# Altium footprint library con-samtec.PCBLIB: 805 footprints (part 18 of 55)
Each footprint in its own frame and in the unit in brackets; x right, y up, seen from the top. Pads: shape width x height; smd on the part's side, far side on the other; paste and mask are expansions set on the pad; w line width, h text height; cw(c..) or ccw(c..) is an arc to the next point about the centre after c.
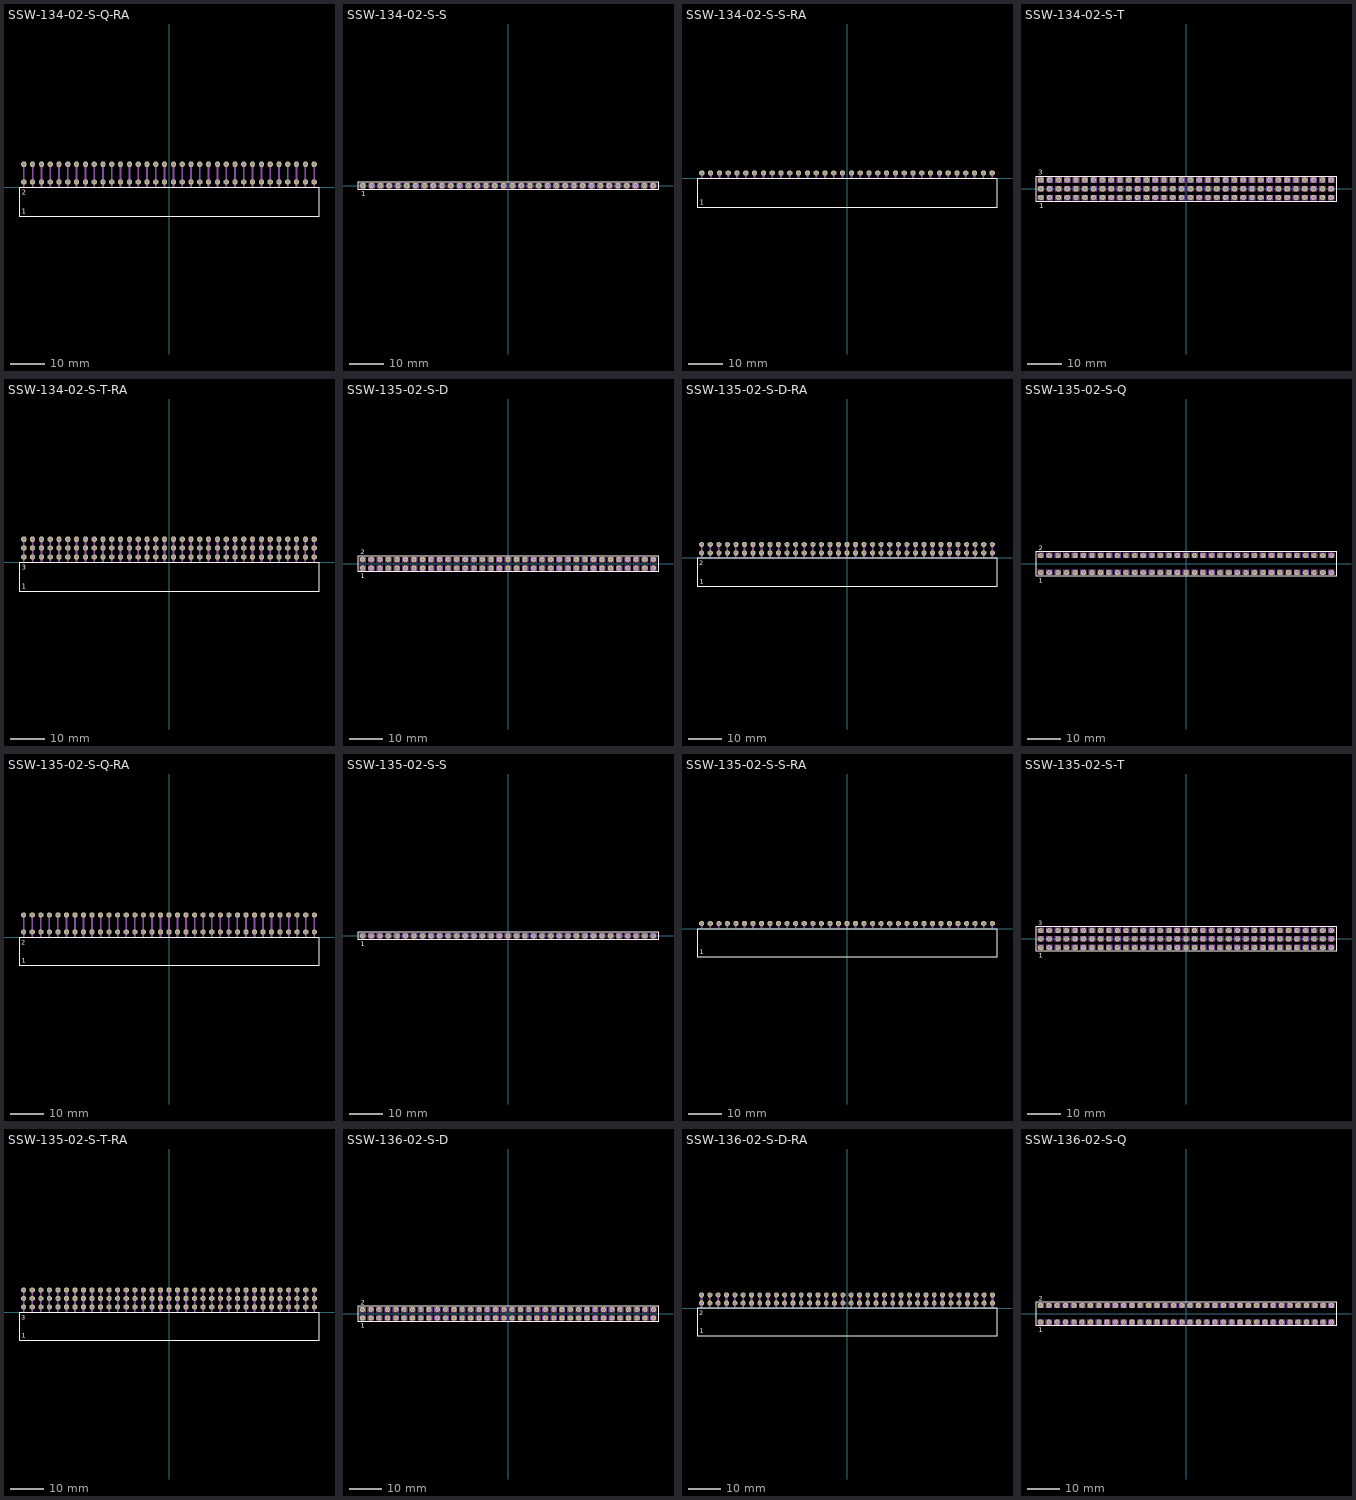
[diagram p17: the footprints below, top view; thin cyan lines are the x and y axes]

## SSW-134-02-S-Q-RA [mil]
pads (68):
  oct 59.06x59.06 hole 39.37: 1(-1650,60) 2(-1650,260) 3(-1550,60) 4(-1550,260) 5(-1450,60) 6(-1450,260) 7(-1350,60) 8(-1350,260) 9(-1250,60) 10(-1250,260) 11(-1150,60) 12(-1150,260) 13(-1050,60) 14(-1050,260) 15(-950,60) 16(-950,260) 17(-850,60) 18(-850,260) 19(-750,60) 20(-750,260) 21(-650,60) 22(-650,260) 23(-550,60) 24(-550,260) 25(-450,60) 26(-450,260) 27(-350,60) 28(-350,260) 29(-250,60) 30(-250,260) 31(-150,60) 32(-150,260) 33(-50,60) 34(-50,260) 35(50,60) 36(50,260) 37(150,60) 38(150,260) 39(250,60) 40(250,260) 41(350,60) 42(350,260) 43(450,60) 44(450,260) 45(550,60) 46(550,260) 47(650,60) 48(650,260) 49(750,60) 50(750,260) 51(850,60) 52(850,260) 53(950,60) 54(950,260) 55(1050,60) 56(1050,260) 57(1150,60) 58(1150,260) 59(1250,60) 60(1250,260) 61(1350,60) 62(1350,260) 63(1450,60) 64(1450,260) 65(1550,60) 66(1550,260) 67(1650,60) 68(1650,260)
Top Overlay:
  lines w8: -1705.08,-330.55 1705.08,-330.55 1705.08,-4.17 -1705.08,-4.17 -1705.08,-330.55
  text "1" at -1673.43,-301.18 h56.1
  text "2" at -1676.38,-86.61 h56.1
Mechanical 16:
  rectangle: -1660,0 -1640,270
  rectangle: -1560,0 -1540,270
  rectangle: -1460,0 -1440,270
  rectangle: -1360,0 -1340,270
  rectangle: -1260,0 -1240,270
  rectangle: -1160,0 -1140,270
  rectangle: -1060,0 -1040,270
  rectangle: -960,0 -940,270
  rectangle: -860,0 -840,270
  rectangle: -760,0 -740,270
  rectangle: -660,0 -640,270
  rectangle: -560,0 -540,270
  rectangle: -460,0 -440,270
  rectangle: -360,0 -340,270
  rectangle: -260,0 -240,270
  rectangle: -160,0 -140,270
  rectangle: -60,0 -40,270
  rectangle: 40,0 60,270
  rectangle: 140,0 160,270
  rectangle: 240,0 260,270
  rectangle: 340,0 360,270
  rectangle: 440,0 460,270
  rectangle: 540,0 560,270
  rectangle: 640,0 660,270
  rectangle: 740,0 760,270
  rectangle: 840,0 860,270
  rectangle: 940,0 960,270
  rectangle: 1040,0 1060,270
  rectangle: 1140,0 1160,270
  rectangle: 1240,0 1260,270
  rectangle: 1340,0 1360,270
  rectangle: 1440,0 1460,270
  rectangle: 1540,0 1560,270
  rectangle: 1640,0 1660,270

## SSW-134-02-S-S [mm]
pads (34):
  oct 1.5x1.5 hole 1: 1(-41.91,0) 2(-39.37,0) 3(-36.83,0) 4(-34.29,0) 5(-31.75,0) 6(-29.21,0) 7(-26.67,0) 8(-24.13,0) 9(-21.59,0) 10(-19.05,0) 11(-16.51,0) 12(-13.97,0) 13(-11.43,0) 14(-8.89,0) 15(-6.35,0) 16(-3.81,0) 17(-1.27,0) 18(1.27,0) 19(3.81,0) 20(6.35,0) 21(8.89,0) 22(11.43,0) 23(13.97,0) 24(16.51,0) 25(19.05,0) 26(21.59,0) 27(24.13,0) 28(26.67,0) 29(29.21,0) 30(31.75,0) 31(34.29,0) 32(36.83,0) 33(39.37,0) 34(41.91,0)
Top Overlay:
  lines w0.203: -43.309,-1.155 43.309,-1.155 43.309,1.155 -43.309,1.155 -43.309,-1.155
  text "1" at -42.418,-3.048 h1.42
Mechanical 16:
  lines w0.203: -42.655,-0.745 -41.155,-0.745 -41.155,0.755 -42.655,0.755 -42.655,-0.745 ; -40.115,-0.745 -38.615,-0.745 -38.615,0.755 -40.115,0.755 -40.115,-0.745 ; -37.575,-0.745 -36.075,-0.745 -36.075,0.755 -37.575,0.755 -37.575,-0.745 ; -35.035,-0.745 -33.535,-0.745 -33.535,0.755 -35.035,0.755 -35.035,-0.745 ; -32.495,-0.745 -30.995,-0.745 -30.995,0.755 -32.495,0.755 -32.495,-0.745 ; -29.955,-0.745 -28.455,-0.745 -28.455,0.755 -29.955,0.755 -29.955,-0.745 ; -27.415,-0.745 -25.915,-0.745 -25.915,0.755 -27.415,0.755 -27.415,-0.745 ; -24.875,-0.745 -23.375,-0.745 -23.375,0.755 -24.875,0.755 -24.875,-0.745 ; -22.335,-0.745 -20.835,-0.745 -20.835,0.755 -22.335,0.755 -22.335,-0.745 ; -19.795,-0.745 -18.295,-0.745 -18.295,0.755 -19.795,0.755 -19.795,-0.745 ; -17.255,-0.745 -15.755,-0.745 -15.755,0.755 -17.255,0.755 -17.255,-0.745 ; -14.715,-0.745 -13.215,-0.745 -13.215,0.755 -14.715,0.755 -14.715,-0.745 ; -12.175,-0.745 -10.675,-0.745 -10.675,0.755 -12.175,0.755 -12.175,-0.745 ; -9.635,-0.745 -8.135,-0.745 -8.135,0.755 -9.635,0.755 -9.635,-0.745 ; -7.095,-0.745 -5.595,-0.745 -5.595,0.755 -7.095,0.755 -7.095,-0.745 ; -4.555,-0.745 -3.055,-0.745 -3.055,0.755 -4.555,0.755 -4.555,-0.745 ; -2.015,-0.745 -0.515,-0.745 -0.515,0.755 -2.015,0.755 -2.015,-0.745 ; 0.525,-0.745 2.025,-0.745 2.025,0.755 0.525,0.755 0.525,-0.745 ; 3.065,-0.745 4.565,-0.745 4.565,0.755 3.065,0.755 3.065,-0.745 ; 5.605,-0.745 7.105,-0.745 7.105,0.755 5.605,0.755 5.605,-0.745 ; 8.145,-0.745 9.645,-0.745 9.645,0.755 8.145,0.755 8.145,-0.745 ; 10.685,-0.745 12.185,-0.745 12.185,0.755 10.685,0.755 10.685,-0.745 ; 13.225,-0.745 14.725,-0.745 14.725,0.755 13.225,0.755 13.225,-0.745 ; 15.765,-0.745 17.265,-0.745 17.265,0.755 15.765,0.755 15.765,-0.745 ; 18.305,-0.745 19.805,-0.745 19.805,0.755 18.305,0.755 18.305,-0.745 ; 20.845,-0.745 22.345,-0.745 22.345,0.755 20.845,0.755 20.845,-0.745 ; 23.385,-0.745 24.885,-0.745 24.885,0.755 23.385,0.755 23.385,-0.745 ; 25.925,-0.745 27.425,-0.745 27.425,0.755 25.925,0.755 25.925,-0.745 ; 28.465,-0.745 29.965,-0.745 29.965,0.755 28.465,0.755 28.465,-0.745 ; 31.005,-0.745 32.505,-0.745 32.505,0.755 31.005,0.755 31.005,-0.745 ; 33.545,-0.745 35.045,-0.745 35.045,0.755 33.545,0.755 33.545,-0.745 ; 36.085,-0.745 37.585,-0.745 37.585,0.755 36.085,0.755 36.085,-0.745 ; 38.625,-0.745 40.125,-0.745 40.125,0.755 38.625,0.755 38.625,-0.745 ; 41.165,-0.745 42.665,-0.745 42.665,0.755 41.165,0.755 41.165,-0.745

## SSW-134-02-S-S-RA [mil]
pads (34):
  oct 59.06x59.06 hole 39.37: 1(-1650,60) 2(-1550,60) 3(-1450,60) 4(-1350,60) 5(-1250,60) 6(-1150,60) 7(-1050,60) 8(-950,60) 9(-850,60) 10(-750,60) 11(-650,60) 12(-550,60) 13(-450,60) 14(-350,60) 15(-250,60) 16(-150,60) 17(-50,60) 18(50,60) 19(150,60) 20(250,60) 21(350,60) 22(450,60) 23(550,60) 24(650,60) 25(750,60) 26(850,60) 27(950,60) 28(1050,60) 29(1150,60) 30(1250,60) 31(1350,60) 32(1450,60) 33(1550,60) 34(1650,60)
Top Overlay:
  lines w8: -1705.08,-330.55 1705.08,-330.55 1705.08,-4.17 -1705.08,-4.17 -1705.08,-330.55
  text "1" at -1673.43,-301.18 h56.1
Mechanical 16:
  rectangle: -1660,0 -1640,70
  rectangle: -1560,0 -1540,70
  rectangle: -1460,0 -1440,70
  rectangle: -1360,0 -1340,70
  rectangle: -1260,0 -1240,70
  rectangle: -1160,0 -1140,70
  rectangle: -1060,0 -1040,70
  rectangle: -960,0 -940,70
  rectangle: -860,0 -840,70
  rectangle: -760,0 -740,70
  rectangle: -660,0 -640,70
  rectangle: -560,0 -540,70
  rectangle: -460,0 -440,70
  rectangle: -360,0 -340,70
  rectangle: -260,0 -240,70
  rectangle: -160,0 -140,70
  rectangle: -60,0 -40,70
  rectangle: 40,0 60,70
  rectangle: 140,0 160,70
  rectangle: 240,0 260,70
  rectangle: 340,0 360,70
  rectangle: 440,0 460,70
  rectangle: 540,0 560,70
  rectangle: 640,0 660,70
  rectangle: 740,0 760,70
  rectangle: 840,0 860,70
  rectangle: 940,0 960,70
  rectangle: 1040,0 1060,70
  rectangle: 1140,0 1160,70
  rectangle: 1240,0 1260,70
  rectangle: 1340,0 1360,70
  rectangle: 1440,0 1460,70
  rectangle: 1540,0 1560,70
  rectangle: 1640,0 1660,70

## SSW-134-02-S-T [mm]
pads (102):
  oct 1.5x1.5 hole 1: 1(-41.91,-2.54) 2(-41.91,0) 3(-41.91,2.54) 4(-39.37,-2.54) 5(-39.37,0) 6(-39.37,2.54) 7(-36.83,-2.54) 8(-36.83,0) 9(-36.83,2.54) 10(-34.29,-2.54) 11(-34.29,0) 12(-34.29,2.54) 13(-31.75,-2.54) 14(-31.75,0) 15(-31.75,2.54) 16(-29.21,-2.54) 17(-29.21,0) 18(-29.21,2.54) 19(-26.67,-2.54) 20(-26.67,0) 21(-26.67,2.54) 22(-24.13,-2.54) 23(-24.13,0) 24(-24.13,2.54) 25(-21.59,-2.54) 26(-21.59,0) 27(-21.59,2.54) 28(-19.05,-2.54) 29(-19.05,0) 30(-19.05,2.54) 31(-16.51,-2.54) 32(-16.51,0) 33(-16.51,2.54) 34(-13.97,-2.54) 35(-13.97,0) 36(-13.97,2.54) 37(-11.43,-2.54) 38(-11.43,0) 39(-11.43,2.54) 40(-8.89,-2.54) 41(-8.89,0) 42(-8.89,2.54) 43(-6.35,-2.54) 44(-6.35,0) 45(-6.35,2.54) 46(-3.81,-2.54) 47(-3.81,0) 48(-3.81,2.54) 49(-1.27,-2.54) 50(-1.27,0) 51(-1.27,2.54) 52(1.27,-2.54) 53(1.27,0) 54(1.27,2.54) 55(3.81,-2.54) 56(3.81,0) 57(3.81,2.54) 58(6.35,-2.54) 59(6.35,0) 60(6.35,2.54) 61(8.89,-2.54) 62(8.89,0) 63(8.89,2.54) 64(11.43,-2.54) 65(11.43,0) 66(11.43,2.54) 67(13.97,-2.54) 68(13.97,0) 69(13.97,2.54) 70(16.51,-2.54) 71(16.51,0) 72(16.51,2.54) 73(19.05,-2.54) 74(19.05,0) 75(19.05,2.54) 76(21.59,-2.54) 77(21.59,0) 78(21.59,2.54) 79(24.13,-2.54) 80(24.13,0) 81(24.13,2.54) 82(26.67,-2.54) 83(26.67,0) 84(26.67,2.54) 85(29.21,-2.54) 86(29.21,0) 87(29.21,2.54) 88(31.75,-2.54) 89(31.75,0) 90(31.75,2.54) 91(34.29,-2.54) 92(34.29,0) 93(34.29,2.54) 94(36.83,-2.54) 95(36.83,0) 96(36.83,2.54) 97(39.37,-2.54) 98(39.37,0) 99(39.37,2.54) 100(41.91,-2.54) 101(41.91,0) 102(41.91,2.54)
Top Overlay:
  lines w0.203: -43.309,-3.695 43.309,-3.695 43.309,3.695 -43.309,3.695 -43.309,-3.695
  text "1" at -42.418,-5.588 h1.42
  text "3" at -42.672,4.064 h1.42
Mechanical 16:
  drawing of 408 lines, arcs and shapes, not listed

## SSW-134-02-S-T-RA [mil]
pads (102):
  oct 59.06x59.06 hole 39.37: 1(-1650,60) 2(-1650,160) 3(-1650,260) 4(-1550,60) 5(-1550,160) 6(-1550,260) 7(-1450,60) 8(-1450,160) 9(-1450,260) 10(-1350,60) 11(-1350,160) 12(-1350,260) 13(-1250,60) 14(-1250,160) 15(-1250,260) 16(-1150,60) 17(-1150,160) 18(-1150,260) 19(-1050,60) 20(-1050,160) 21(-1050,260) 22(-950,60) 23(-950,160) 24(-950,260) 25(-850,60) 26(-850,160) 27(-850,260) 28(-750,60) 29(-750,160) 30(-750,260) 31(-650,60) 32(-650,160) 33(-650,260) 34(-550,60) 35(-550,160) 36(-550,260) 37(-450,60) 38(-450,160) 39(-450,260) 40(-350,60) 41(-350,160) 42(-350,260) 43(-250,60) 44(-250,160) 45(-250,260) 46(-150,60) 47(-150,160) 48(-150,260) 49(-50,60) 50(-50,160) 51(-50,260) 52(50,60) 53(50,160) 54(50,260) 55(150,60) 56(150,160) 57(150,260) 58(250,60) 59(250,160) 60(250,260) 61(350,60) 62(350,160) 63(350,260) 64(450,60) 65(450,160) 66(450,260) 67(550,60) 68(550,160) 69(550,260) 70(650,60) 71(650,160) 72(650,260) 73(750,60) 74(750,160) 75(750,260) 76(850,60) 77(850,160) 78(850,260) 79(950,60) 80(950,160) 81(950,260) 82(1050,60) 83(1050,160) 84(1050,260) 85(1150,60) 86(1150,160) 87(1150,260) 88(1250,60) 89(1250,160) 90(1250,260) 91(1350,60) 92(1350,160) 93(1350,260) 94(1450,60) 95(1450,160) 96(1450,260) 97(1550,60) 98(1550,160) 99(1550,260) 100(1650,60) 101(1650,160) 102(1650,260)
Top Overlay:
  lines w8: -1705.08,-330.55 1705.08,-330.55 1705.08,-4.17 -1705.08,-4.17 -1705.08,-330.55
  text "1" at -1673.43,-301.18 h56.1
  text "3" at -1676.38,-86.61 h56.1
Mechanical 16:
  rectangle: -1660,0 -1640,270
  rectangle: -1560,0 -1540,270
  rectangle: -1460,0 -1440,270
  rectangle: -1360,0 -1340,270
  rectangle: -1260,0 -1240,270
  rectangle: -1160,0 -1140,270
  rectangle: -1060,0 -1040,270
  rectangle: -960,0 -940,270
  rectangle: -860,0 -840,270
  rectangle: -760,0 -740,270
  rectangle: -660,0 -640,270
  rectangle: -560,0 -540,270
  rectangle: -460,0 -440,270
  rectangle: -360,0 -340,270
  rectangle: -260,0 -240,270
  rectangle: -160,0 -140,270
  rectangle: -60,0 -40,270
  rectangle: 40,0 60,270
  rectangle: 140,0 160,270
  rectangle: 240,0 260,270
  rectangle: 340,0 360,270
  rectangle: 440,0 460,270
  rectangle: 540,0 560,270
  rectangle: 640,0 660,270
  rectangle: 740,0 760,270
  rectangle: 840,0 860,270
  rectangle: 940,0 960,270
  rectangle: 1040,0 1060,270
  rectangle: 1140,0 1160,270
  rectangle: 1240,0 1260,270
  rectangle: 1340,0 1360,270
  rectangle: 1440,0 1460,270
  rectangle: 1540,0 1560,270
  rectangle: 1640,0 1660,270

## SSW-135-02-S-D [mm]
pads (70):
  oct 1.5x1.5 hole 1: 1(-43.18,-1.27) 2(-43.18,1.27) 3(-40.64,-1.27) 4(-40.64,1.27) 5(-38.1,-1.27) 6(-38.1,1.27) 7(-35.56,-1.27) 8(-35.56,1.27) 9(-33.02,-1.27) 10(-33.02,1.27) 11(-30.48,-1.27) 12(-30.48,1.27) 13(-27.94,-1.27) 14(-27.94,1.27) 15(-25.4,-1.27) 16(-25.4,1.27) 17(-22.86,-1.27) 18(-22.86,1.27) 19(-20.32,-1.27) 20(-20.32,1.27) 21(-17.78,-1.27) 22(-17.78,1.27) 23(-15.24,-1.27) 24(-15.24,1.27) 25(-12.7,-1.27) 26(-12.7,1.27) 27(-10.16,-1.27) 28(-10.16,1.27) 29(-7.62,-1.27) 30(-7.62,1.27) 31(-5.08,-1.27) 32(-5.08,1.27) 33(-2.54,-1.27) 34(-2.54,1.27) 35(0,-1.27) 36(0,1.27) 37(2.54,-1.27) 38(2.54,1.27) 39(5.08,-1.27) 40(5.08,1.27) 41(7.62,-1.27) 42(7.62,1.27) 43(10.16,-1.27) 44(10.16,1.27) 45(12.7,-1.27) 46(12.7,1.27) 47(15.24,-1.27) 48(15.24,1.27) 49(17.78,-1.27) 50(17.78,1.27) 51(20.32,-1.27) 52(20.32,1.27) 53(22.86,-1.27) 54(22.86,1.27) 55(25.4,-1.27) 56(25.4,1.27) 57(27.94,-1.27) 58(27.94,1.27) 59(30.48,-1.27) 60(30.48,1.27) 61(33.02,-1.27) 62(33.02,1.27) 63(35.56,-1.27) 64(35.56,1.27) 65(38.1,-1.27) 66(38.1,1.27) 67(40.64,-1.27) 68(40.64,1.27) 69(43.18,-1.27) 70(43.18,1.27)
Top Overlay:
  lines w0.203: -44.579,-2.425 44.579,-2.425 44.579,2.425 -44.579,2.425 -44.579,-2.425
  text "1" at -43.688,-4.318 h1.42
  text "2" at -43.688,2.794 h1.42
Mechanical 16:
  drawing of 280 lines, arcs and shapes, not listed

## SSW-135-02-S-D-RA [mil]
pads (70):
  oct 59.06x59.06 hole 39.37: 1(-1700,60) 2(-1700,160) 3(-1600,60) 4(-1600,160) 5(-1500,60) 6(-1500,160) 7(-1400,60) 8(-1400,160) 9(-1300,60) 10(-1300,160) 11(-1200,60) 12(-1200,160) 13(-1100,60) 14(-1100,160) 15(-1000,60) 16(-1000,160) 17(-900,60) 18(-900,160) 19(-800,60) 20(-800,160) 21(-700,60) 22(-700,160) 23(-600,60) 24(-600,160) 25(-500,60) 26(-500,160) 27(-400,60) 28(-400,160) 29(-300,60) 30(-300,160) 31(-200,60) 32(-200,160) 33(-100,60) 34(-100,160) 35(0,60) 36(0,160) 37(100,60) 38(100,160) 39(200,60) 40(200,160) 41(300,60) 42(300,160) 43(400,60) 44(400,160) 45(500,60) 46(500,160) 47(600,60) 48(600,160) 49(700,60) 50(700,160) 51(800,60) 52(800,160) 53(900,60) 54(900,160) 55(1000,60) 56(1000,160) 57(1100,60) 58(1100,160) 59(1200,60) 60(1200,160) 61(1300,60) 62(1300,160) 63(1400,60) 64(1400,160) 65(1500,60) 66(1500,160) 67(1600,60) 68(1600,160) 69(1700,60) 70(1700,160)
Top Overlay:
  lines w8: -1755.08,-330.55 1755.08,-330.55 1755.08,-4.17 -1755.08,-4.17 -1755.08,-330.55
  text "1" at -1723.43,-301.18 h56.1
  text "2" at -1726.38,-86.61 h56.1
Mechanical 16:
  rectangle: -1710,0 -1690,170
  rectangle: -1610,0 -1590,170
  rectangle: -1510,0 -1490,170
  rectangle: -1410,0 -1390,170
  rectangle: -1310,0 -1290,170
  rectangle: -1210,0 -1190,170
  rectangle: -1110,0 -1090,170
  rectangle: -1010,0 -990,170
  rectangle: -910,0 -890,170
  rectangle: -810,0 -790,170
  rectangle: -710,0 -690,170
  rectangle: -610,0 -590,170
  rectangle: -510,0 -490,170
  rectangle: -410,0 -390,170
  rectangle: -310,0 -290,170
  rectangle: -210,0 -190,170
  rectangle: -110,0 -90,170
  rectangle: -10,0 10,170
  rectangle: 90,0 110,170
  rectangle: 190,0 210,170
  rectangle: 290,0 310,170
  rectangle: 390,0 410,170
  rectangle: 490,0 510,170
  rectangle: 590,0 610,170
  rectangle: 690,0 710,170
  rectangle: 790,0 810,170
  rectangle: 890,0 910,170
  rectangle: 990,0 1010,170
  rectangle: 1090,0 1110,170
  rectangle: 1190,0 1210,170
  rectangle: 1290,0 1310,170
  rectangle: 1390,0 1410,170
  rectangle: 1490,0 1510,170
  rectangle: 1590,0 1610,170
  rectangle: 1690,0 1710,170

## SSW-135-02-S-Q [mm]
pads (70):
  oct 1.5x1.5 hole 1: 1(-43.18,-2.54) 2(-43.18,2.54) 3(-40.64,-2.54) 4(-40.64,2.54) 5(-38.1,-2.54) 6(-38.1,2.54) 7(-35.56,-2.54) 8(-35.56,2.54) 9(-33.02,-2.54) 10(-33.02,2.54) 11(-30.48,-2.54) 12(-30.48,2.54) 13(-27.94,-2.54) 14(-27.94,2.54) 15(-25.4,-2.54) 16(-25.4,2.54) 17(-22.86,-2.54) 18(-22.86,2.54) 19(-20.32,-2.54) 20(-20.32,2.54) 21(-17.78,-2.54) 22(-17.78,2.54) 23(-15.24,-2.54) 24(-15.24,2.54) 25(-12.7,-2.54) 26(-12.7,2.54) 27(-10.16,-2.54) 28(-10.16,2.54) 29(-7.62,-2.54) 30(-7.62,2.54) 31(-5.08,-2.54) 32(-5.08,2.54) 33(-2.54,-2.54) 34(-2.54,2.54) 35(0,-2.54) 36(0,2.54) 37(2.54,-2.54) 38(2.54,2.54) 39(5.08,-2.54) 40(5.08,2.54) 41(7.62,-2.54) 42(7.62,2.54) 43(10.16,-2.54) 44(10.16,2.54) 45(12.7,-2.54) 46(12.7,2.54) 47(15.24,-2.54) 48(15.24,2.54) 49(17.78,-2.54) 50(17.78,2.54) 51(20.32,-2.54) 52(20.32,2.54) 53(22.86,-2.54) 54(22.86,2.54) 55(25.4,-2.54) 56(25.4,2.54) 57(27.94,-2.54) 58(27.94,2.54) 59(30.48,-2.54) 60(30.48,2.54) 61(33.02,-2.54) 62(33.02,2.54) 63(35.56,-2.54) 64(35.56,2.54) 65(38.1,-2.54) 66(38.1,2.54) 67(40.64,-2.54) 68(40.64,2.54) 69(43.18,-2.54) 70(43.18,2.54)
Top Overlay:
  lines w0.203: -44.579,-3.695 44.579,-3.695 44.579,3.695 -44.579,3.695 -44.579,-3.695
  text "1" at -43.688,-5.588 h1.42
  text "2" at -43.688,4.064 h1.42
Mechanical 16:
  drawing of 280 lines, arcs and shapes, not listed

## SSW-135-02-S-Q-RA [mil]
pads (70):
  oct 59.06x59.06 hole 39.37: 1(-1700,60) 2(-1700,260) 3(-1600,60) 4(-1600,260) 5(-1500,60) 6(-1500,260) 7(-1400,60) 8(-1400,260) 9(-1300,60) 10(-1300,260) 11(-1200,60) 12(-1200,260) 13(-1100,60) 14(-1100,260) 15(-1000,60) 16(-1000,260) 17(-900,60) 18(-900,260) 19(-800,60) 20(-800,260) 21(-700,60) 22(-700,260) 23(-600,60) 24(-600,260) 25(-500,60) 26(-500,260) 27(-400,60) 28(-400,260) 29(-300,60) 30(-300,260) 31(-200,60) 32(-200,260) 33(-100,60) 34(-100,260) 35(0,60) 36(0,260) 37(100,60) 38(100,260) 39(200,60) 40(200,260) 41(300,60) 42(300,260) 43(400,60) 44(400,260) 45(500,60) 46(500,260) 47(600,60) 48(600,260) 49(700,60) 50(700,260) 51(800,60) 52(800,260) 53(900,60) 54(900,260) 55(1000,60) 56(1000,260) 57(1100,60) 58(1100,260) 59(1200,60) 60(1200,260) 61(1300,60) 62(1300,260) 63(1400,60) 64(1400,260) 65(1500,60) 66(1500,260) 67(1600,60) 68(1600,260) 69(1700,60) 70(1700,260)
Top Overlay:
  lines w8: -1755.08,-330.55 1755.08,-330.55 1755.08,-4.17 -1755.08,-4.17 -1755.08,-330.55
  text "1" at -1723.43,-301.18 h56.1
  text "2" at -1726.38,-86.61 h56.1
Mechanical 16:
  rectangle: -1710,0 -1690,270
  rectangle: -1610,0 -1590,270
  rectangle: -1510,0 -1490,270
  rectangle: -1410,0 -1390,270
  rectangle: -1310,0 -1290,270
  rectangle: -1210,0 -1190,270
  rectangle: -1110,0 -1090,270
  rectangle: -1010,0 -990,270
  rectangle: -910,0 -890,270
  rectangle: -810,0 -790,270
  rectangle: -710,0 -690,270
  rectangle: -610,0 -590,270
  rectangle: -510,0 -490,270
  rectangle: -410,0 -390,270
  rectangle: -310,0 -290,270
  rectangle: -210,0 -190,270
  rectangle: -110,0 -90,270
  rectangle: -10,0 10,270
  rectangle: 90,0 110,270
  rectangle: 190,0 210,270
  rectangle: 290,0 310,270
  rectangle: 390,0 410,270
  rectangle: 490,0 510,270
  rectangle: 590,0 610,270
  rectangle: 690,0 710,270
  rectangle: 790,0 810,270
  rectangle: 890,0 910,270
  rectangle: 990,0 1010,270
  rectangle: 1090,0 1110,270
  rectangle: 1190,0 1210,270
  rectangle: 1290,0 1310,270
  rectangle: 1390,0 1410,270
  rectangle: 1490,0 1510,270
  rectangle: 1590,0 1610,270
  rectangle: 1690,0 1710,270

## SSW-135-02-S-S [mm]
pads (35):
  oct 1.5x1.5 hole 1: 1(-43.18,0) 2(-40.64,0) 3(-38.1,0) 4(-35.56,0) 5(-33.02,0) 6(-30.48,0) 7(-27.94,0) 8(-25.4,0) 9(-22.86,0) 10(-20.32,0) 11(-17.78,0) 12(-15.24,0) 13(-12.7,0) 14(-10.16,0) 15(-7.62,0) 16(-5.08,0) 17(-2.54,0) 18(0,0) 19(2.54,0) 20(5.08,0) 21(7.62,0) 22(10.16,0) 23(12.7,0) 24(15.24,0) 25(17.78,0) 26(20.32,0) 27(22.86,0) 28(25.4,0) 29(27.94,0) 30(30.48,0) 31(33.02,0) 32(35.56,0) 33(38.1,0) 34(40.64,0) 35(43.18,0)
Top Overlay:
  lines w0.203: -44.579,-1.155 44.579,-1.155 44.579,1.155 -44.579,1.155 -44.579,-1.155
  text "1" at -43.688,-3.048 h1.42
Mechanical 16:
  lines w0.203: -43.925,-0.745 -42.425,-0.745 -42.425,0.755 -43.925,0.755 -43.925,-0.745 ; -41.385,-0.745 -39.885,-0.745 -39.885,0.755 -41.385,0.755 -41.385,-0.745 ; -38.845,-0.745 -37.345,-0.745 -37.345,0.755 -38.845,0.755 -38.845,-0.745 ; -36.305,-0.745 -34.805,-0.745 -34.805,0.755 -36.305,0.755 -36.305,-0.745 ; -33.765,-0.745 -32.265,-0.745 -32.265,0.755 -33.765,0.755 -33.765,-0.745 ; -31.225,-0.745 -29.725,-0.745 -29.725,0.755 -31.225,0.755 -31.225,-0.745 ; -28.685,-0.745 -27.185,-0.745 -27.185,0.755 -28.685,0.755 -28.685,-0.745 ; -26.145,-0.745 -24.645,-0.745 -24.645,0.755 -26.145,0.755 -26.145,-0.745 ; -23.605,-0.745 -22.105,-0.745 -22.105,0.755 -23.605,0.755 -23.605,-0.745 ; -21.065,-0.745 -19.565,-0.745 -19.565,0.755 -21.065,0.755 -21.065,-0.745 ; -18.525,-0.745 -17.025,-0.745 -17.025,0.755 -18.525,0.755 -18.525,-0.745 ; -15.985,-0.745 -14.485,-0.745 -14.485,0.755 -15.985,0.755 -15.985,-0.745 ; -13.445,-0.745 -11.945,-0.745 -11.945,0.755 -13.445,0.755 -13.445,-0.745 ; -10.905,-0.745 -9.405,-0.745 -9.405,0.755 -10.905,0.755 -10.905,-0.745 ; -8.365,-0.745 -6.865,-0.745 -6.865,0.755 -8.365,0.755 -8.365,-0.745 ; -5.825,-0.745 -4.325,-0.745 -4.325,0.755 -5.825,0.755 -5.825,-0.745 ; -3.285,-0.745 -1.785,-0.745 -1.785,0.755 -3.285,0.755 -3.285,-0.745 ; -0.745,-0.745 0.755,-0.745 0.755,0.755 -0.745,0.755 -0.745,-0.745 ; 1.795,-0.745 3.295,-0.745 3.295,0.755 1.795,0.755 1.795,-0.745 ; 4.335,-0.745 5.835,-0.745 5.835,0.755 4.335,0.755 4.335,-0.745 ; 6.875,-0.745 8.375,-0.745 8.375,0.755 6.875,0.755 6.875,-0.745 ; 9.415,-0.745 10.915,-0.745 10.915,0.755 9.415,0.755 9.415,-0.745 ; 11.955,-0.745 13.455,-0.745 13.455,0.755 11.955,0.755 11.955,-0.745 ; 14.495,-0.745 15.995,-0.745 15.995,0.755 14.495,0.755 14.495,-0.745 ; 17.035,-0.745 18.535,-0.745 18.535,0.755 17.035,0.755 17.035,-0.745 ; 19.575,-0.745 21.075,-0.745 21.075,0.755 19.575,0.755 19.575,-0.745 ; 22.115,-0.745 23.615,-0.745 23.615,0.755 22.115,0.755 22.115,-0.745 ; 24.655,-0.745 26.155,-0.745 26.155,0.755 24.655,0.755 24.655,-0.745 ; 27.195,-0.745 28.695,-0.745 28.695,0.755 27.195,0.755 27.195,-0.745 ; 29.735,-0.745 31.235,-0.745 31.235,0.755 29.735,0.755 29.735,-0.745 ; 32.275,-0.745 33.775,-0.745 33.775,0.755 32.275,0.755 32.275,-0.745 ; 34.815,-0.745 36.315,-0.745 36.315,0.755 34.815,0.755 34.815,-0.745 ; 37.355,-0.745 38.855,-0.745 38.855,0.755 37.355,0.755 37.355,-0.745 ; 39.895,-0.745 41.395,-0.745 41.395,0.755 39.895,0.755 39.895,-0.745 ; 42.435,-0.745 43.935,-0.745 43.935,0.755 42.435,0.755 42.435,-0.745

## SSW-135-02-S-S-RA [mil]
pads (35):
  oct 59.06x59.06 hole 39.37: 1(-1700,60) 2(-1600,60) 3(-1500,60) 4(-1400,60) 5(-1300,60) 6(-1200,60) 7(-1100,60) 8(-1000,60) 9(-900,60) 10(-800,60) 11(-700,60) 12(-600,60) 13(-500,60) 14(-400,60) 15(-300,60) 16(-200,60) 17(-100,60) 18(0,60) 19(100,60) 20(200,60) 21(300,60) 22(400,60) 23(500,60) 24(600,60) 25(700,60) 26(800,60) 27(900,60) 28(1000,60) 29(1100,60) 30(1200,60) 31(1300,60) 32(1400,60) 33(1500,60) 34(1600,60) 35(1700,60)
Top Overlay:
  lines w8: -1755.08,-330.55 1755.08,-330.55 1755.08,-4.17 -1755.08,-4.17 -1755.08,-330.55
  text "1" at -1723.43,-301.18 h56.1
Mechanical 16:
  rectangle: -1710,0 -1690,70
  rectangle: -1610,0 -1590,70
  rectangle: -1510,0 -1490,70
  rectangle: -1410,0 -1390,70
  rectangle: -1310,0 -1290,70
  rectangle: -1210,0 -1190,70
  rectangle: -1110,0 -1090,70
  rectangle: -1010,0 -990,70
  rectangle: -910,0 -890,70
  rectangle: -810,0 -790,70
  rectangle: -710,0 -690,70
  rectangle: -610,0 -590,70
  rectangle: -510,0 -490,70
  rectangle: -410,0 -390,70
  rectangle: -310,0 -290,70
  rectangle: -210,0 -190,70
  rectangle: -110,0 -90,70
  rectangle: -10,0 10,70
  rectangle: 90,0 110,70
  rectangle: 190,0 210,70
  rectangle: 290,0 310,70
  rectangle: 390,0 410,70
  rectangle: 490,0 510,70
  rectangle: 590,0 610,70
  rectangle: 690,0 710,70
  rectangle: 790,0 810,70
  rectangle: 890,0 910,70
  rectangle: 990,0 1010,70
  rectangle: 1090,0 1110,70
  rectangle: 1190,0 1210,70
  rectangle: 1290,0 1310,70
  rectangle: 1390,0 1410,70
  rectangle: 1490,0 1510,70
  rectangle: 1590,0 1610,70
  rectangle: 1690,0 1710,70

## SSW-135-02-S-T [mm]
pads (105):
  oct 1.5x1.5 hole 1: 1(-43.18,-2.54) 2(-43.18,0) 3(-43.18,2.54) 4(-40.64,-2.54) 5(-40.64,0) 6(-40.64,2.54) 7(-38.1,-2.54) 8(-38.1,0) 9(-38.1,2.54) 10(-35.56,-2.54) 11(-35.56,0) 12(-35.56,2.54) 13(-33.02,-2.54) 14(-33.02,0) 15(-33.02,2.54) 16(-30.48,-2.54) 17(-30.48,0) 18(-30.48,2.54) 19(-27.94,-2.54) 20(-27.94,0) 21(-27.94,2.54) 22(-25.4,-2.54) 23(-25.4,0) 24(-25.4,2.54) 25(-22.86,-2.54) 26(-22.86,0) 27(-22.86,2.54) 28(-20.32,-2.54) 29(-20.32,0) 30(-20.32,2.54) 31(-17.78,-2.54) 32(-17.78,0) 33(-17.78,2.54) 34(-15.24,-2.54) 35(-15.24,0) 36(-15.24,2.54) 37(-12.7,-2.54) 38(-12.7,0) 39(-12.7,2.54) 40(-10.16,-2.54) 41(-10.16,0) 42(-10.16,2.54) 43(-7.62,-2.54) 44(-7.62,0) 45(-7.62,2.54) 46(-5.08,-2.54) 47(-5.08,0) 48(-5.08,2.54) 49(-2.54,-2.54) 50(-2.54,0) 51(-2.54,2.54) 52(0,-2.54) 53(0,0) 54(0,2.54) 55(2.54,-2.54) 56(2.54,0) 57(2.54,2.54) 58(5.08,-2.54) 59(5.08,0) 60(5.08,2.54) 61(7.62,-2.54) 62(7.62,0) 63(7.62,2.54) 64(10.16,-2.54) 65(10.16,0) 66(10.16,2.54) 67(12.7,-2.54) 68(12.7,0) 69(12.7,2.54) 70(15.24,-2.54) 71(15.24,0) 72(15.24,2.54) 73(17.78,-2.54) 74(17.78,0) 75(17.78,2.54) 76(20.32,-2.54) 77(20.32,0) 78(20.32,2.54) 79(22.86,-2.54) 80(22.86,0) 81(22.86,2.54) 82(25.4,-2.54) 83(25.4,0) 84(25.4,2.54) 85(27.94,-2.54) 86(27.94,0) 87(27.94,2.54) 88(30.48,-2.54) 89(30.48,0) 90(30.48,2.54) 91(33.02,-2.54) 92(33.02,0) 93(33.02,2.54) 94(35.56,-2.54) 95(35.56,0) 96(35.56,2.54) 97(38.1,-2.54) 98(38.1,0) 99(38.1,2.54) 100(40.64,-2.54) 101(40.64,0) 102(40.64,2.54) 103(43.18,-2.54) 104(43.18,0) 105(43.18,2.54)
Top Overlay:
  lines w0.203: -44.579,-3.695 44.579,-3.695 44.579,3.695 -44.579,3.695 -44.579,-3.695
  text "1" at -43.688,-5.588 h1.42
  text "3" at -43.942,4.064 h1.42
Mechanical 16:
  drawing of 420 lines, arcs and shapes, not listed

## SSW-135-02-S-T-RA [mil]
pads (105):
  oct 59.06x59.06 hole 39.37: 1(-1700,60) 2(-1700,160) 3(-1700,260) 4(-1600,60) 5(-1600,160) 6(-1600,260) 7(-1500,60) 8(-1500,160) 9(-1500,260) 10(-1400,60) 11(-1400,160) 12(-1400,260) 13(-1300,60) 14(-1300,160) 15(-1300,260) 16(-1200,60) 17(-1200,160) 18(-1200,260) 19(-1100,60) 20(-1100,160) 21(-1100,260) 22(-1000,60) 23(-1000,160) 24(-1000,260) 25(-900,60) 26(-900,160) 27(-900,260) 28(-800,60) 29(-800,160) 30(-800,260) 31(-700,60) 32(-700,160) 33(-700,260) 34(-600,60) 35(-600,160) 36(-600,260) 37(-500,60) 38(-500,160) 39(-500,260) 40(-400,60) 41(-400,160) 42(-400,260) 43(-300,60) 44(-300,160) 45(-300,260) 46(-200,60) 47(-200,160) 48(-200,260) 49(-100,60) 50(-100,160) 51(-100,260) 52(0,60) 53(0,160) 54(0,260) 55(100,60) 56(100,160) 57(100,260) 58(200,60) 59(200,160) 60(200,260) 61(300,60) 62(300,160) 63(300,260) 64(400,60) 65(400,160) 66(400,260) 67(500,60) 68(500,160) 69(500,260) 70(600,60) 71(600,160) 72(600,260) 73(700,60) 74(700,160) 75(700,260) 76(800,60) 77(800,160) 78(800,260) 79(900,60) 80(900,160) 81(900,260) 82(1000,60) 83(1000,160) 84(1000,260) 85(1100,60) 86(1100,160) 87(1100,260) 88(1200,60) 89(1200,160) 90(1200,260) 91(1300,60) 92(1300,160) 93(1300,260) 94(1400,60) 95(1400,160) 96(1400,260) 97(1500,60) 98(1500,160) 99(1500,260) 100(1600,60) 101(1600,160) 102(1600,260) 103(1700,60) 104(1700,160) 105(1700,260)
Top Overlay:
  lines w8: -1755.08,-330.55 1755.08,-330.55 1755.08,-4.17 -1755.08,-4.17 -1755.08,-330.55
  text "1" at -1723.43,-301.18 h56.1
  text "3" at -1726.38,-86.61 h56.1
Mechanical 16:
  rectangle: -1710,0 -1690,270
  rectangle: -1610,0 -1590,270
  rectangle: -1510,0 -1490,270
  rectangle: -1410,0 -1390,270
  rectangle: -1310,0 -1290,270
  rectangle: -1210,0 -1190,270
  rectangle: -1110,0 -1090,270
  rectangle: -1010,0 -990,270
  rectangle: -910,0 -890,270
  rectangle: -810,0 -790,270
  rectangle: -710,0 -690,270
  rectangle: -610,0 -590,270
  rectangle: -510,0 -490,270
  rectangle: -410,0 -390,270
  rectangle: -310,0 -290,270
  rectangle: -210,0 -190,270
  rectangle: -110,0 -90,270
  rectangle: -10,0 10,270
  rectangle: 90,0 110,270
  rectangle: 190,0 210,270
  rectangle: 290,0 310,270
  rectangle: 390,0 410,270
  rectangle: 490,0 510,270
  rectangle: 590,0 610,270
  rectangle: 690,0 710,270
  rectangle: 790,0 810,270
  rectangle: 890,0 910,270
  rectangle: 990,0 1010,270
  rectangle: 1090,0 1110,270
  rectangle: 1190,0 1210,270
  rectangle: 1290,0 1310,270
  rectangle: 1390,0 1410,270
  rectangle: 1490,0 1510,270
  rectangle: 1590,0 1610,270
  rectangle: 1690,0 1710,270

## SSW-136-02-S-D [mm]
pads (72):
  oct 1.5x1.5 hole 1: 1(-44.45,-1.27) 2(-44.45,1.27) 3(-41.91,-1.27) 4(-41.91,1.27) 5(-39.37,-1.27) 6(-39.37,1.27) 7(-36.83,-1.27) 8(-36.83,1.27) 9(-34.29,-1.27) 10(-34.29,1.27) 11(-31.75,-1.27) 12(-31.75,1.27) 13(-29.21,-1.27) 14(-29.21,1.27) 15(-26.67,-1.27) 16(-26.67,1.27) 17(-24.13,-1.27) 18(-24.13,1.27) 19(-21.59,-1.27) 20(-21.59,1.27) 21(-19.05,-1.27) 22(-19.05,1.27) 23(-16.51,-1.27) 24(-16.51,1.27) 25(-13.97,-1.27) 26(-13.97,1.27) 27(-11.43,-1.27) 28(-11.43,1.27) 29(-8.89,-1.27) 30(-8.89,1.27) 31(-6.35,-1.27) 32(-6.35,1.27) 33(-3.81,-1.27) 34(-3.81,1.27) 35(-1.27,-1.27) 36(-1.27,1.27) 37(1.27,-1.27) 38(1.27,1.27) 39(3.81,-1.27) 40(3.81,1.27) 41(6.35,-1.27) 42(6.35,1.27) 43(8.89,-1.27) 44(8.89,1.27) 45(11.43,-1.27) 46(11.43,1.27) 47(13.97,-1.27) 48(13.97,1.27) 49(16.51,-1.27) 50(16.51,1.27) 51(19.05,-1.27) 52(19.05,1.27) 53(21.59,-1.27) 54(21.59,1.27) 55(24.13,-1.27) 56(24.13,1.27) 57(26.67,-1.27) 58(26.67,1.27) 59(29.21,-1.27) 60(29.21,1.27) 61(31.75,-1.27) 62(31.75,1.27) 63(34.29,-1.27) 64(34.29,1.27) 65(36.83,-1.27) 66(36.83,1.27) 67(39.37,-1.27) 68(39.37,1.27) 69(41.91,-1.27) 70(41.91,1.27) 71(44.45,-1.27) 72(44.45,1.27)
Top Overlay:
  lines w0.203: -45.849,-2.425 45.849,-2.425 45.849,2.425 -45.849,2.425 -45.849,-2.425
  text "1" at -44.958,-4.318 h1.42
  text "2" at -44.958,2.794 h1.42
Mechanical 16:
  drawing of 288 lines, arcs and shapes, not listed

## SSW-136-02-S-D-RA [mil]
pads (72):
  oct 59.06x59.06 hole 39.37: 1(-1750,60) 2(-1750,160) 3(-1650,60) 4(-1650,160) 5(-1550,60) 6(-1550,160) 7(-1450,60) 8(-1450,160) 9(-1350,60) 10(-1350,160) 11(-1250,60) 12(-1250,160) 13(-1150,60) 14(-1150,160) 15(-1050,60) 16(-1050,160) 17(-950,60) 18(-950,160) 19(-850,60) 20(-850,160) 21(-750,60) 22(-750,160) 23(-650,60) 24(-650,160) 25(-550,60) 26(-550,160) 27(-450,60) 28(-450,160) 29(-350,60) 30(-350,160) 31(-250,60) 32(-250,160) 33(-150,60) 34(-150,160) 35(-50,60) 36(-50,160) 37(50,60) 38(50,160) 39(150,60) 40(150,160) 41(250,60) 42(250,160) 43(350,60) 44(350,160) 45(450,60) 46(450,160) 47(550,60) 48(550,160) 49(650,60) 50(650,160) 51(750,60) 52(750,160) 53(850,60) 54(850,160) 55(950,60) 56(950,160) 57(1050,60) 58(1050,160) 59(1150,60) 60(1150,160) 61(1250,60) 62(1250,160) 63(1350,60) 64(1350,160) 65(1450,60) 66(1450,160) 67(1550,60) 68(1550,160) 69(1650,60) 70(1650,160) 71(1750,60) 72(1750,160)
Top Overlay:
  lines w8: -1805.08,-330.55 1805.08,-330.55 1805.08,-4.17 -1805.08,-4.17 -1805.08,-330.55
  text "1" at -1773.43,-301.18 h56.1
  text "2" at -1776.38,-86.61 h56.1
Mechanical 16:
  rectangle: -1760,0 -1740,170
  rectangle: -1660,0 -1640,170
  rectangle: -1560,0 -1540,170
  rectangle: -1460,0 -1440,170
  rectangle: -1360,0 -1340,170
  rectangle: -1260,0 -1240,170
  rectangle: -1160,0 -1140,170
  rectangle: -1060,0 -1040,170
  rectangle: -960,0 -940,170
  rectangle: -860,0 -840,170
  rectangle: -760,0 -740,170
  rectangle: -660,0 -640,170
  rectangle: -560,0 -540,170
  rectangle: -460,0 -440,170
  rectangle: -360,0 -340,170
  rectangle: -260,0 -240,170
  rectangle: -160,0 -140,170
  rectangle: -60,0 -40,170
  rectangle: 40,0 60,170
  rectangle: 140,0 160,170
  rectangle: 240,0 260,170
  rectangle: 340,0 360,170
  rectangle: 440,0 460,170
  rectangle: 540,0 560,170
  rectangle: 640,0 660,170
  rectangle: 740,0 760,170
  rectangle: 840,0 860,170
  rectangle: 940,0 960,170
  rectangle: 1040,0 1060,170
  rectangle: 1140,0 1160,170
  rectangle: 1240,0 1260,170
  rectangle: 1340,0 1360,170
  rectangle: 1440,0 1460,170
  rectangle: 1540,0 1560,170
  rectangle: 1640,0 1660,170
  rectangle: 1740,0 1760,170

## SSW-136-02-S-Q [mm]
pads (72):
  oct 1.5x1.5 hole 1: 1(-44.45,-2.54) 2(-44.45,2.54) 3(-41.91,-2.54) 4(-41.91,2.54) 5(-39.37,-2.54) 6(-39.37,2.54) 7(-36.83,-2.54) 8(-36.83,2.54) 9(-34.29,-2.54) 10(-34.29,2.54) 11(-31.75,-2.54) 12(-31.75,2.54) 13(-29.21,-2.54) 14(-29.21,2.54) 15(-26.67,-2.54) 16(-26.67,2.54) 17(-24.13,-2.54) 18(-24.13,2.54) 19(-21.59,-2.54) 20(-21.59,2.54) 21(-19.05,-2.54) 22(-19.05,2.54) 23(-16.51,-2.54) 24(-16.51,2.54) 25(-13.97,-2.54) 26(-13.97,2.54) 27(-11.43,-2.54) 28(-11.43,2.54) 29(-8.89,-2.54) 30(-8.89,2.54) 31(-6.35,-2.54) 32(-6.35,2.54) 33(-3.81,-2.54) 34(-3.81,2.54) 35(-1.27,-2.54) 36(-1.27,2.54) 37(1.27,-2.54) 38(1.27,2.54) 39(3.81,-2.54) 40(3.81,2.54) 41(6.35,-2.54) 42(6.35,2.54) 43(8.89,-2.54) 44(8.89,2.54) 45(11.43,-2.54) 46(11.43,2.54) 47(13.97,-2.54) 48(13.97,2.54) 49(16.51,-2.54) 50(16.51,2.54) 51(19.05,-2.54) 52(19.05,2.54) 53(21.59,-2.54) 54(21.59,2.54) 55(24.13,-2.54) 56(24.13,2.54) 57(26.67,-2.54) 58(26.67,2.54) 59(29.21,-2.54) 60(29.21,2.54) 61(31.75,-2.54) 62(31.75,2.54) 63(34.29,-2.54) 64(34.29,2.54) 65(36.83,-2.54) 66(36.83,2.54) 67(39.37,-2.54) 68(39.37,2.54) 69(41.91,-2.54) 70(41.91,2.54) 71(44.45,-2.54) 72(44.45,2.54)
Top Overlay:
  lines w0.203: -45.849,-3.695 45.849,-3.695 45.849,3.695 -45.849,3.695 -45.849,-3.695
  text "1" at -44.958,-5.588 h1.42
  text "2" at -44.958,4.064 h1.42
Mechanical 16:
  drawing of 288 lines, arcs and shapes, not listed